# Altium schematic symbol library NXP_60_26022015.SCHLIB: 1306 symbols (part 25 of 28)
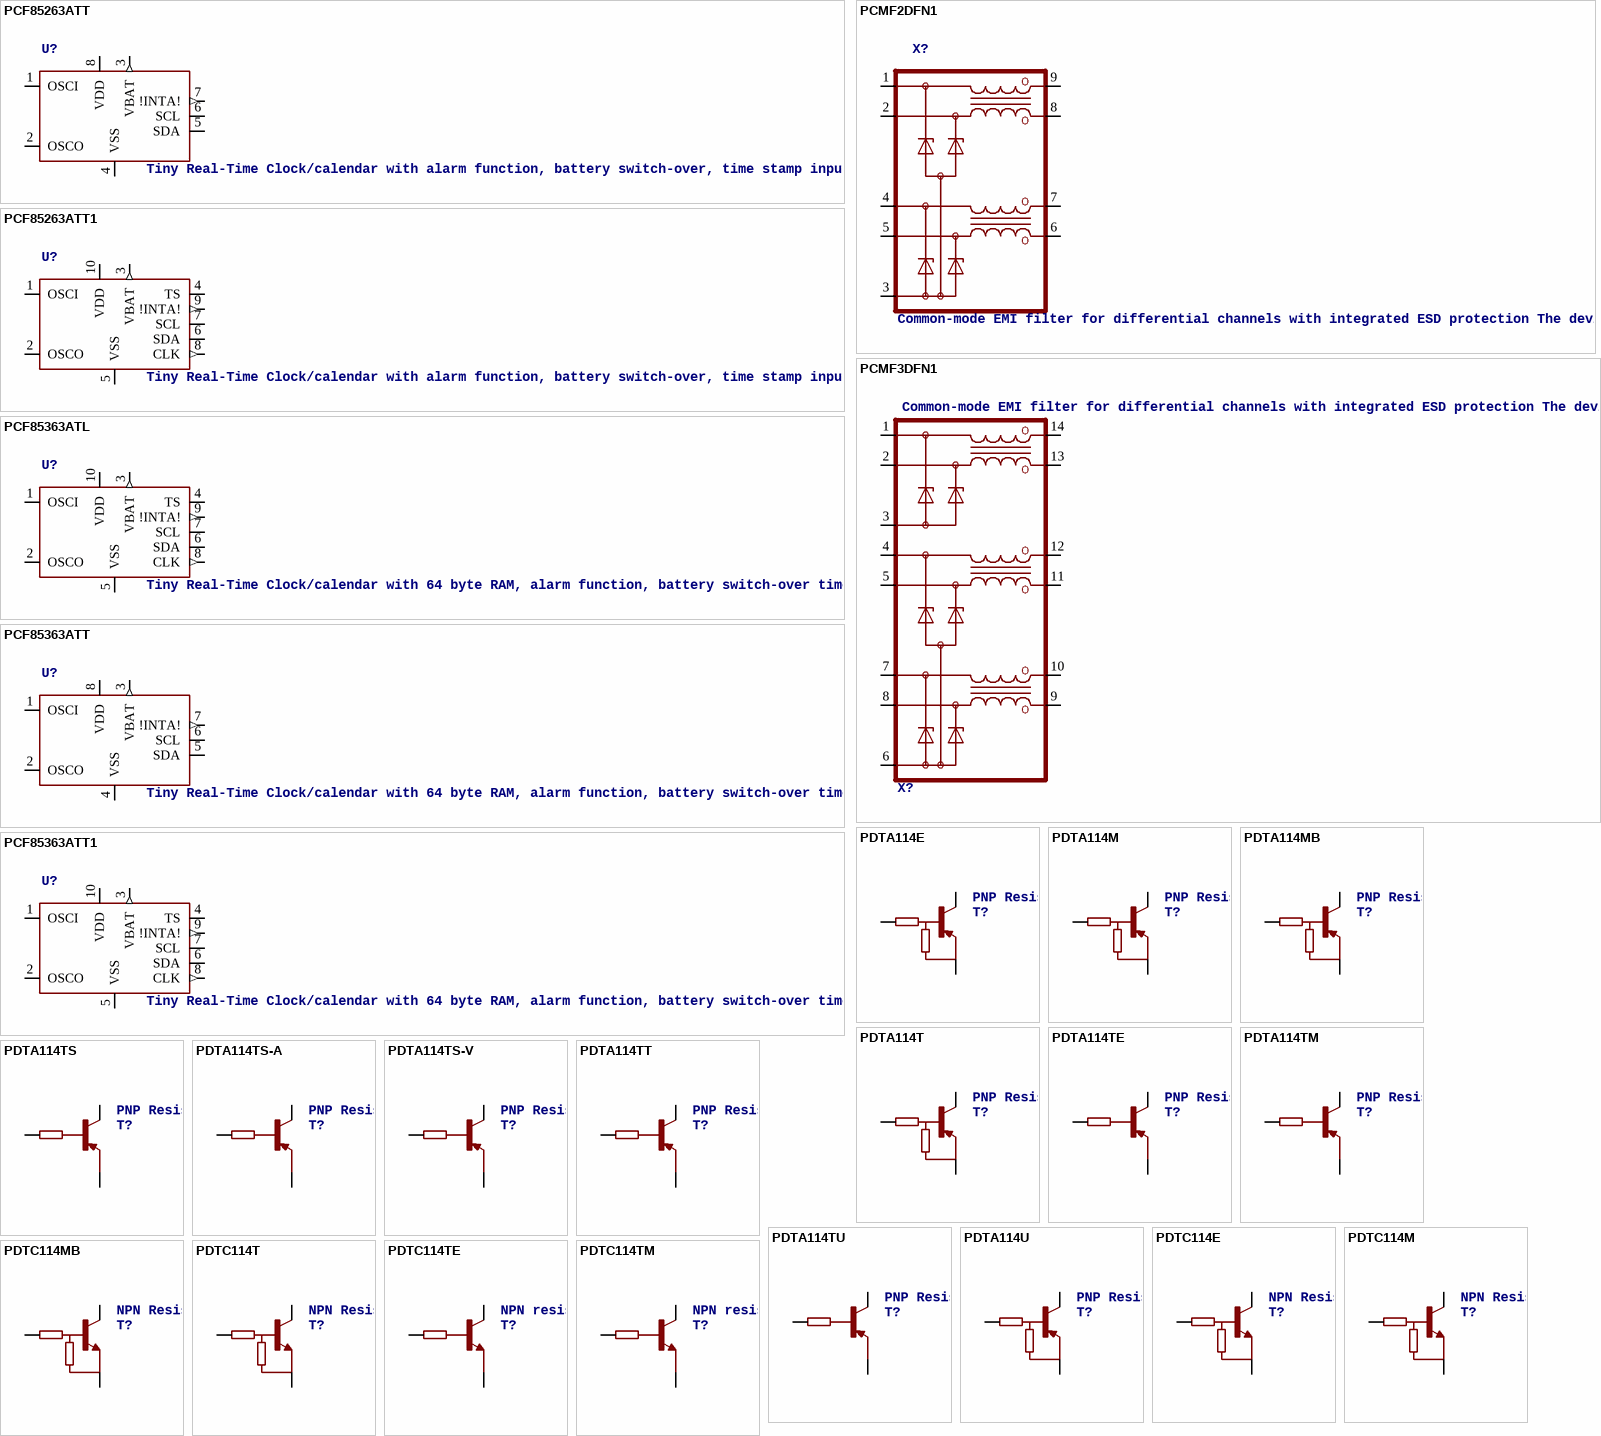
[diagram p209: symbols PCF85263ATT to PDTC114TM]

## PDTA114TT
designator T?, comment PNP Resistor-Equipped Transistor (RET) family in small Surface-Mounted Device (SMD) plastic packages.   AAL Eindhoven MK
footprint SOT23
pins: 1 INPUT, 2 E, 3 C

## PDTA114TU
designator T?, comment PNP Resistor-Equipped Transistor (RET) family in small Surface-Mounted Device (SMD) plastic packages.   AAL Eindhoven MK
footprint SOT323
pins: 1 INPUT, 2 E, 3 C

## PDTA114U
designator T?, comment PNP Resistor-Equipped Transistor (RET) family in small Surface-Mounted Device (SMD) plastic packages.   AAL Eindhoven MK
footprint SOT323
pins: 1 INPUT, 2 E, 3 C

## PDTC114E
designator T?, comment NPN Resistor-Equipped Transistor (RET) family in small Surface-Mounted Device (SMD) plastic packages.   AAL Eindhoven MK
footprint SOT416
pins: 1 INPUT, 2 E, 3 C

## PDTC114M
designator T?, comment NPN Resistor-Equipped Transistor (RET) family in small Surface-Mounted Device (SMD) plastic packages.   AAL Eindhoven MK
footprint SOT883(B)
pins: 1 INPUT, 2 E, 3 C

## PDTC114MB
designator T?, comment NPN Resistor-Equipped Transistor (RET) family in small Surface-Mounted Device (SMD) plastic packages.   AAL Eindhoven MK
footprint SOT883(B)
pins: 1 INPUT, 2 E, 3 C

## PDTC114T
designator T?, comment NPN Resistor-Equipped Transistor (RET) family in small Surface-Mounted Device (SMD) plastic packages.   AAL Eindhoven MK
footprint SOT23
pins: 1 INPUT, 2 E, 3 C

## PDTC114TE
designator T?, comment NPN resistor-equipped transistors; R1 = 10 kΩ, R2 = open NPN Resistor-Equipped Transistor (RET) family in small Surface-Mounted Device (SMD) plastic packages.    AAL Eindhoven MK
footprint SOT416
pins: 1 INPUT, 2 E, 3 C

## PDTC114TM
designator T?, comment NPN resistor-equipped transistors; R1 = 10 kΩ, R2 = open NPN Resistor-Equipped Transistor (RET) family in small Surface-Mounted Device (SMD) plastic packages.    AAL Eindhoven MK
footprint SOT883(B)
pins: 1 INPUT, 2 E, 3 C

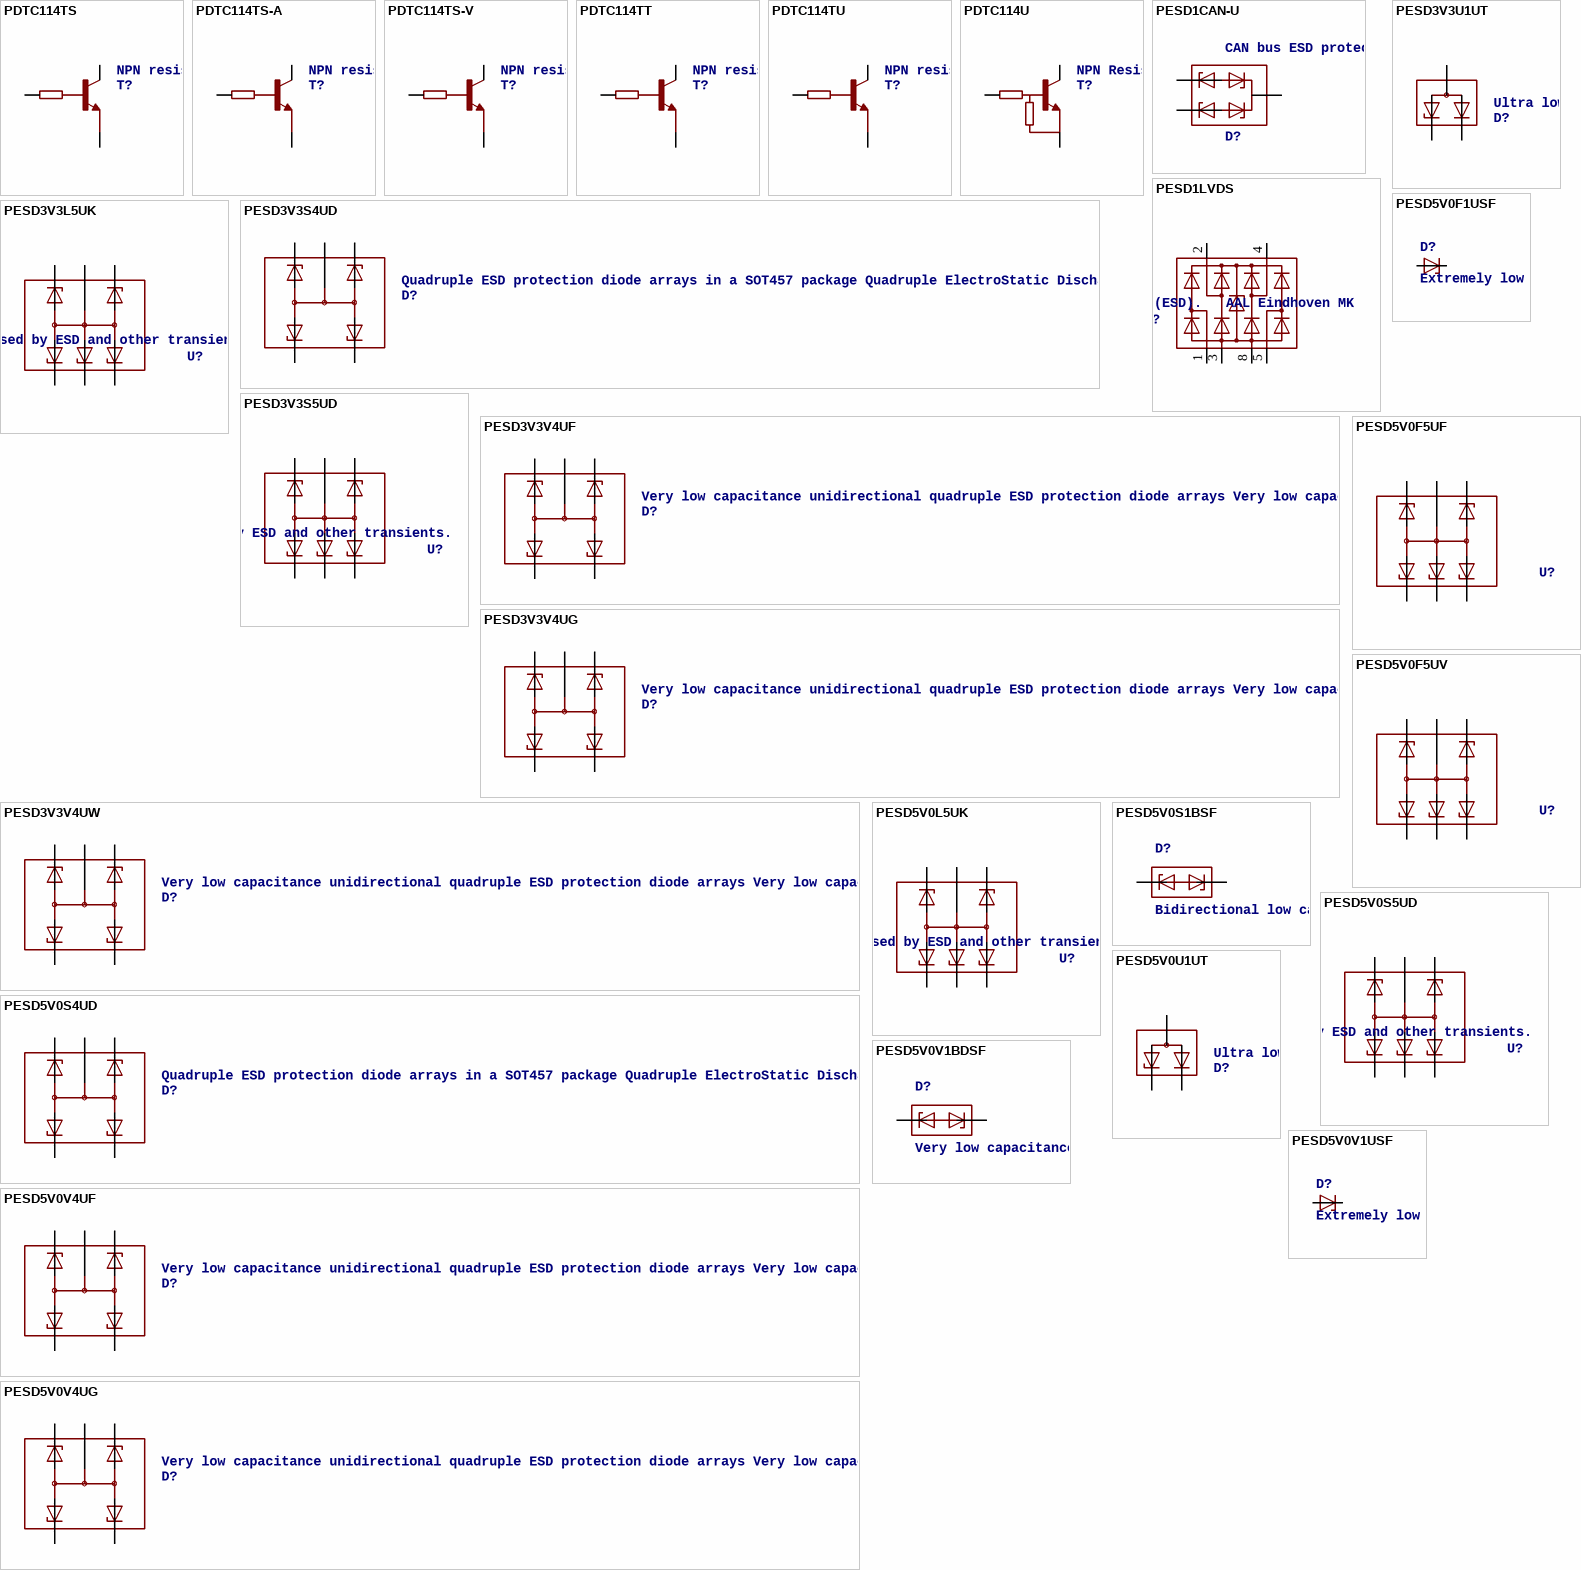
[diagram p167: symbols PDTC114TS to PESD5V0V4UG]

## PDTC114TS
designator T?, comment NPN resistor-equipped transistors; R1 = 10 kΩ, R2 = open NPN Resistor-Equipped Transistor (RET) family in small Surface-Mounted Device (SMD) plastic packages.    AAL Eindhoven MK
footprint SOT54
pins: 1 INPUT, 2 C, 3 E

## PDTC114TS-A
designator T?, comment NPN resistor-equipped transistors; R1 = 10 kΩ, R2 = open NPN Resistor-Equipped Transistor (RET) family in small Surface-Mounted Device (SMD) plastic packages.    AAL Eindhoven MK
footprint SOT54A
pins: 1 INPUT, 2 C, 3 E

## PDTC114TS-V
designator T?, comment NPN resistor-equipped transistors; R1 = 10 kΩ, R2 = open NPN Resistor-Equipped Transistor (RET) family in small Surface-Mounted Device (SMD) plastic packages.    AAL Eindhoven MK
footprint SOT54V
pins: 1 INPUT, 2 C, 3 E

## PDTC114TT
designator T?, comment NPN resistor-equipped transistors; R1 = 10 kΩ, R2 = open NPN Resistor-Equipped Transistor (RET) family in small Surface-Mounted Device (SMD) plastic packages.    AAL Eindhoven MK
footprint SOT23
pins: 1 INPUT, 2 E, 3 C

## PDTC114TU
designator T?, comment NPN resistor-equipped transistors; R1 = 10 kΩ, R2 = open NPN Resistor-Equipped Transistor (RET) family in small Surface-Mounted Device (SMD) plastic packages.    AAL Eindhoven MK
footprint SOT323
pins: 1 INPUT, 2 E, 3 C

## PDTC114U
designator T?, comment NPN Resistor-Equipped Transistor (RET) family in small Surface-Mounted Device (SMD) plastic packages.   AAL Eindhoven MK
footprint SOT323
pins: 1 INPUT, 2 E, 3 C

## PESD1CAN-U
designator D?, comment CAN bus ESD protection diode ElectroStatic Discharge (ESD) protection diode in a very small SOT323 (SC-70 ) Surface-Mounted Device (SMD) plastic package designed to protect two automotive Controller Area Network (CAN) bus lines from the damage caused by ESD and other transients.    AAL Eindhoven MK
footprint SOT323
pins: 1 K1, 2 K2, 3 CK

## PESD1LVDS
designator ?, comment ESD protection for in-vehicle ultra high-speed interfaces The device is designed to protect in-vehicle ultra high-speed interfaces in automotive applications, such as Low-Voltage Differential Signaling (LVDS), High-Definition Multimedia Interface (HDMI) and DisplayPort interfaces against ElectroStatic Discharge (ESD).   AAL Eindhoven MK
footprint SOT1165-1
pins: 1 CH1-, 2 CH1+, 3 GND@1 (power), 4 CH2-, 5 CH2+, 8 GND@2 (power)

## PESD3V3L5UK
designator U?, comment Low capacitance unidirectional fivefold ESD protection diode arrays Low capacitance unidirectional fivefold ElectroStatic Discharge (ESD) protection diode arrays in a leadless ultra small SOT891 Surface-Mounted Device (SMD) plastic package designed to protect up to five unidirectional signal lines from the damage caused by ESD and other transients.    AAL Eindhoven MK
footprint SOT891
pins: 1 K1, 2 CA, 3 K2, 4 K3, 5 K4, 6 K5

## PESD3V3S4UD
designator D?, comment Quadruple ESD protection diode arrays in a SOT457 package Quadruple ElectroStatic Discharge (ESD) protection diode arrays in a SOT457 (SC-74) small Surface-Mounted Device (SMD) plastic package designed to protect up to 4 signal lines from the damage caused by ESD and other transients.    AAL Eindhoven MK
footprint SOT457
pins: 1 K1, 2 5 CA, 3 K2, 4 K3, 6 K4

## PESD3V3S5UD
designator U?, comment Fivefold ESD protection diode arrays Fivefold ElectroStatic Discharge (ESD) protection diode arrays in a SOT457 (SC-74) small Surface-Mounted Device (SMD) plastic package designed to protect up to ﬁve signal lines from the damage caused by ESD and other transients.    AAL Eindhoven MK
footprint SOT457
pins: 1 K1, 2 CA, 3 K2, 4 K3, 5 K4, 6 K5

## PESD3V3U1UT
designator D?, comment Ultra low capacitance ESD protection diode in SOT23 package Ultra low capacitance ElectroStatic Discharge (ESD) protection diode in a SOT23 (TO-236AB) small SMD plastic package designed to protect one high-speed data line from the damage caused by ESD and other transients.    AAL Eindhoven MK
footprint SOT23
pins: 1 KESD, 2 KD, 3 CA

## PESD3V3V4UF
designator D?, comment Very low capacitance unidirectional quadruple ESD protection diode arrays Very low capacitance unidirectional quadruple ElectroStatic Discharge (ESD) protection diode arrays in small Surface-Mounted Device (SMD) plastic packages designed to protect up to four signal lines from the damage caused by ESD and other transients.    AAL Eindhoven MK
footprint SOT886
pins: 1 K1, 2 5 CA, 3 K2, 4 K3, 6 K4

## PESD3V3V4UG
designator D?, comment Very low capacitance unidirectional quadruple ESD protection diode arrays Very low capacitance unidirectional quadruple ElectroStatic Discharge (ESD) protection diode arrays in small Surface-Mounted Device (SMD) plastic packages designed to protect up to four signal lines from the damage caused by ESD and other transients.    AAL Eindhoven MK
footprint SOT353-1
pins: 1 K1, 2 CA, 3 K2, 4 K3, 5 K4

## PESD3V3V4UW
designator D?, comment Very low capacitance unidirectional quadruple ESD protection diode arrays Very low capacitance unidirectional quadruple ElectroStatic Discharge (ESD) protection diode arrays in small Surface-Mounted Device (SMD) plastic packages designed to protect up to four signal lines from the damage caused by ESD and other transients.    AAL Eindhoven MK
footprint SOT665
pins: 1 K1, 2 CA, 3 K2, 4 K3, 5 K4

## PESD5V0F1USF
designator D?, comment Extremely low capacitance unidirectional ESD protection diode Extremely low capacitance unidirectional ElectroStatic Discharge (ESD) protection diode in a DSN0603-2 (SOD962) leadless ultra small Surface-Mounted Device (SMD) package designed to protect one signal line from the damage caused by ESD and other transients.    AAL Eindhoven MK
footprint SOD962
pins: 1 K, 2 A

## PESD5V0F5UF
designator U?, comment Femtofarad unidirectional fivefold ESD protection array Femtofarad capacitance unidirectional ElectroStatic Discharge (ESD) protection diode array designed to protect up to five signal lines from the damage caused by ESD and other transients. The device is encapsulated in a leadless ultra small DFN1410-6 (SOT886) Surface-Mounted Device (SMD) plastic package. The combination of extremely low capacitance, high ESD maximum rating and ultra small package makes the device ideal for high-speed data line protection and antenna protection applications.    AAL Eindhoven MK
footprint SOT886
pins: 1 K1, 2 CA, 3 K2, 4 K3, 5 K4, 6 K5

## PESD5V0F5UV
designator U?, comment Femtofarad unidirectional fivefold ESD protection array Femtofarad capacitance unidirectional ElectroStatic Discharge (ESD) protection diode array designed to protect up to five signal lines from the damage caused by ESD and other transients. The device is encapsulated in an ultra small and flat lead SOT666 Surface-Mounted Device (SMD) plastic package. The combination of extremely low capacitance, high ESD maximum rating and ultra small package makes the device ideal for high-speed data line protection and antenna protection applications.    AAL Eindhoven MK
footprint SOT666
pins: 1 K1, 2 CA, 3 K2, 4 K3, 5 K4, 6 K5

## PESD5V0L5UK
designator U?, comment Low capacitance unidirectional fivefold ESD protection diode arrays Low capacitance unidirectional fivefold ElectroStatic Discharge (ESD) protection diode arrays in a leadless ultra small SOT891 Surface-Mounted Device (SMD) plastic package designed to protect up to five unidirectional signal lines from the damage caused by ESD and other transients.    AAL Eindhoven MK
footprint SOT891
pins: 1 K1, 2 CA, 3 K2, 4 K3, 5 K4, 6 K5

## PESD5V0S1BSF
designator D?, comment Bidirectional low capacitance ESD protection diode Low capacitance bidirectional ElectroStatic Discharge (ESD) protection diode in a SOD962 leadless ultra small Surface-Mounted Device (SMD) package designed to protect one signal line from the damage caused by ESD and other transients.    AAL Eindhoven MK
footprint SOD962
pins: 1 K1, 2 K2

## PESD5V0S4UD
designator D?, comment Quadruple ESD protection diode arrays in a SOT457 package Quadruple ElectroStatic Discharge (ESD) protection diode arrays in a SOT457 (SC-74) small Surface-Mounted Device (SMD) plastic package designed to protect up to 4 signal lines from the damage caused by ESD and other transients.    AAL Eindhoven MK
footprint SOT457
pins: 1 K1, 2 5 CA, 3 K2, 4 K3, 6 K4

## PESD5V0S5UD
designator U?, comment Fivefold ESD protection diode arrays Fivefold ElectroStatic Discharge (ESD) protection diode arrays in a SOT457 (SC-74) small Surface-Mounted Device (SMD) plastic package designed to protect up to ﬁve signal lines from the damage caused by ESD and other transients.    AAL Eindhoven MK
footprint SOT457
pins: 1 K1, 2 CA, 3 K2, 4 K3, 5 K4, 6 K5

## PESD5V0U1UT
designator D?, comment Ultra low capacitance ESD protection diode in SOT23 package Ultra low capacitance ElectroStatic Discharge (ESD) protection diode in a SOT23 (TO-236AB) small SMD plastic package designed to protect one high-speed data line from the damage caused by ESD and other transients.    AAL Eindhoven MK
footprint SOT23
pins: 1 KESD, 2 KD, 3 CA

## PESD5V0V1BDSF
designator D?, comment Very low capacitance bidirectional ESD protection diode Very low capacitance bidirectional ElectroStatic Discharge (ESD) protection diode in a DSN0603-2 (SOD962) leadless ultra small Surface-Mounted Device (SMD) package designed to protect one signal line from the damage caused by ESD and other transients.    AAL Eindhoven MK
footprint SOD962
pins: 1 K1, 2 K2

## PESD5V0V1USF
designator D?, comment Extremely low capacitance unidirectional ESD protection diode Very low capacitance unidirectional ElectroStatic Discharge (ESD) protection diode designed to protect one signal line from the damage caused by ESD and other transients. The device is encapsulated in a leadless super small DSN0603-2 (SOD962) Surface-Mounted Device (SMD) package.    AAL Eindhoven MK
footprint SOD962
pins: 1 K, 2 A

## PESD5V0V4UF
designator D?, comment Very low capacitance unidirectional quadruple ESD protection diode arrays Very low capacitance unidirectional quadruple ElectroStatic Discharge (ESD) protection diode arrays in small Surface-Mounted Device (SMD) plastic packages designed to protect up to four signal lines from the damage caused by ESD and other transients.    AAL Eindhoven MK
footprint SOT886
pins: 1 K1, 2 5 CA, 3 K2, 4 K3, 6 K4

## PESD5V0V4UG
designator D?, comment Very low capacitance unidirectional quadruple ESD protection diode arrays Very low capacitance unidirectional quadruple ElectroStatic Discharge (ESD) protection diode arrays in small Surface-Mounted Device (SMD) plastic packages designed to protect up to four signal lines from the damage caused by ESD and other transients.    AAL Eindhoven MK
footprint SOT353-1
pins: 1 K1, 2 CA, 3 K2, 4 K3, 5 K4

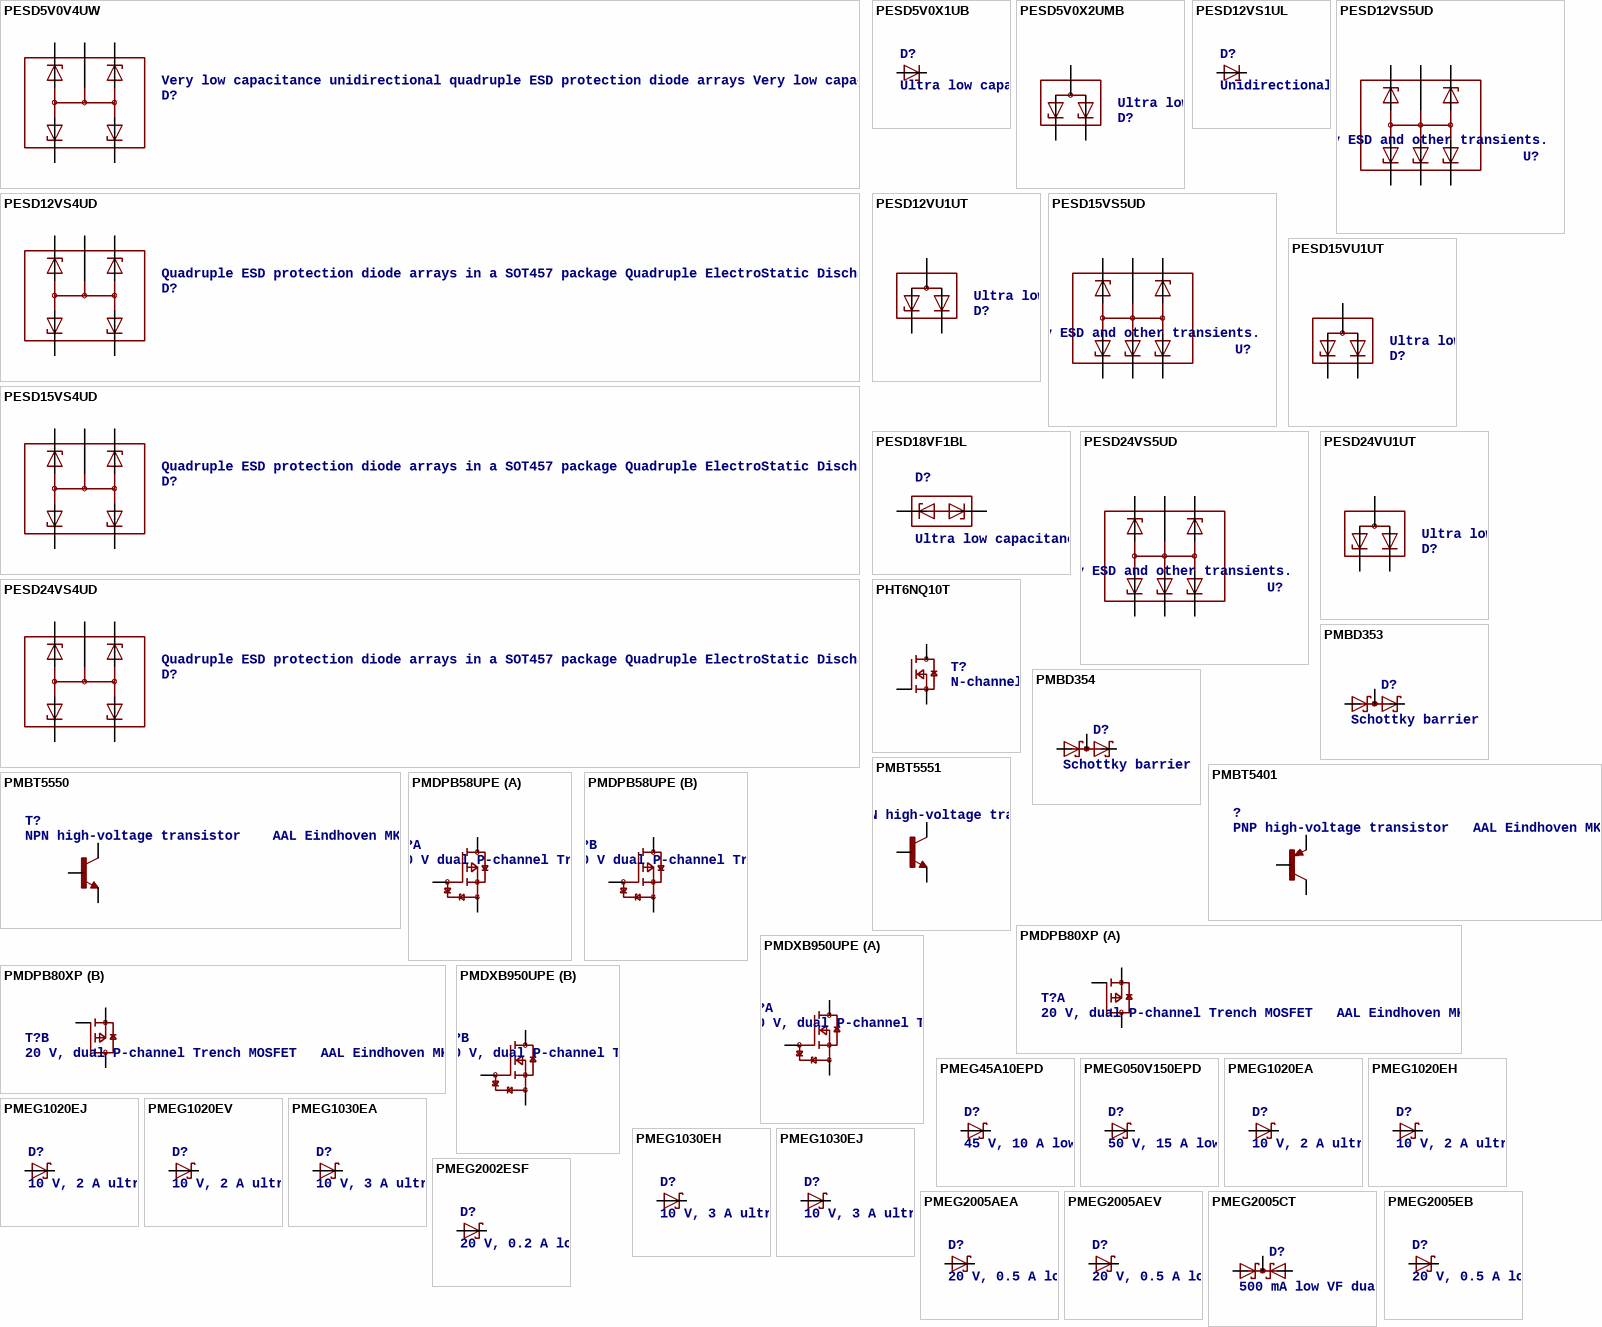
[diagram p168: symbols PESD5V0V4UW to PMEG2005EB]

## PESD5V0V4UW
designator D?, comment Very low capacitance unidirectional quadruple ESD protection diode arrays Very low capacitance unidirectional quadruple ElectroStatic Discharge (ESD) protection diode arrays in small Surface-Mounted Device (SMD) plastic packages designed to protect up to four signal lines from the damage caused by ESD and other transients.    AAL Eindhoven MK
footprint SOT665
pins: 1 K1, 2 CA, 3 K2, 4 K3, 5 K4

## PESD5V0X1UB
designator D?, comment Ultra low capacitance unidirectional ESD protection diode Ultra low capacitance unidirectional ElectroStatic Discharge (ESD) protection diode in a SOD523 (SC-79) ultra small and flat lead Surface-Mounted Device (SMD) plastic package designed to protect one signal line from the damage caused by ESD and other transients. The combination of extremely low capacitance and ultra low clamping voltage makes the device ideal for high-speed data line protection applications.    AAL Eindhoven MK
footprint SOD523
pins: 1 K, 2 A

## PESD5V0X2UMB
designator D?, comment Ultra low capacitance unidirectional double ESD protection diode Ultra low capacitance unidirectional double ElectroStatic Discharge (ESD) protection diode in a DFN1006B-3 (SOT883B) leadless ultra small Surface-Mounted Device (SMD) plastic package designed to protect up to two signal lines from the damage caused by ESD and other transients.    AAL Eindhoven MK
footprint SOT883(B)
pins: 1 K1, 2 K2, 3 CA

## PESD12VS1UL
designator D?, comment Unidirectional ESD protection diodes Unidirectional ElectroStatic Discharge (ESD) protection diodes in a SOD882 leadless ultra small Surface Mounted Device (SMD) plastic package designed to protect one signal line from the damage caused by ESD and other transients.    AAL Eindhoven MK
footprint SOD882(T)
pins: 1 K, 2 A

## PESD12VS4UD
designator D?, comment Quadruple ESD protection diode arrays in a SOT457 package Quadruple ElectroStatic Discharge (ESD) protection diode arrays in a SOT457 (SC-74) small Surface-Mounted Device (SMD) plastic package designed to protect up to 4 signal lines from the damage caused by ESD and other transients.    AAL Eindhoven MK
footprint SOT457
pins: 1 K1, 2 5 CA, 3 K2, 4 K3, 6 K4

## PESD12VS5UD
designator U?, comment Fivefold ESD protection diode arrays Fivefold ElectroStatic Discharge (ESD) protection diode arrays in a SOT457 (SC-74) small Surface-Mounted Device (SMD) plastic package designed to protect up to ﬁve signal lines from the damage caused by ESD and other transients.    AAL Eindhoven MK
footprint SOT457
pins: 1 K1, 2 CA, 3 K2, 4 K3, 5 K4, 6 K5

## PESD12VU1UT
designator D?, comment Ultra low capacitance ESD protection diode in SOT23 package Ultra low capacitance ElectroStatic Discharge (ESD) protection diode in a SOT23 (TO-236AB) small SMD plastic package designed to protect one high-speed data line from the damage caused by ESD and other transients.    AAL Eindhoven MK
footprint SOT23
pins: 1 KESD, 2 KD, 3 CA

## PESD15VS4UD
designator D?, comment Quadruple ESD protection diode arrays in a SOT457 package Quadruple ElectroStatic Discharge (ESD) protection diode arrays in a SOT457 (SC-74) small Surface-Mounted Device (SMD) plastic package designed to protect up to 4 signal lines from the damage caused by ESD and other transients.    AAL Eindhoven MK
footprint SOT457
pins: 1 K1, 2 5 CA, 3 K2, 4 K3, 6 K4

## PESD15VS5UD
designator U?, comment Fivefold ESD protection diode arrays Fivefold ElectroStatic Discharge (ESD) protection diode arrays in a SOT457 (SC-74) small Surface-Mounted Device (SMD) plastic package designed to protect up to ﬁve signal lines from the damage caused by ESD and other transients.    AAL Eindhoven MK
footprint SOT457
pins: 1 K1, 2 CA, 3 K2, 4 K3, 5 K4, 6 K5

## PESD15VU1UT
designator D?, comment Ultra low capacitance ESD protection diode in SOT23 package Ultra low capacitance ElectroStatic Discharge (ESD) protection diode in a SOT23 (TO-236AB) small SMD plastic package designed to protect one high-speed data line from the damage caused by ESD and other transients.    AAL Eindhoven MK
footprint SOT23
pins: 1 KESD, 2 KD, 3 CA

## PESD18VF1BL
designator D?, comment Ultra low capacitance bidirectional ESD protection diode Ultra low capacitance bidirectional ElectroStatic Discharge (ESD) protection diode in a DFN1006-2 (SOD882) leadless ultra small Surface-Mounted Device (SMD) plastic package designed to protect one signal line from the damage caused by ESD and other transients.    AAL Eindhoven MK
footprint SOD882(T)
pins: 1 K1, 2 K2
